# Altium footprint library NRF.PcbLib: 1 footprints
Each footprint in its own frame and in the unit in brackets; x right, y up, seen from the top. Pads: shape width x height; smd on the part's side, far side on the other; paste and mask are expansions set on the pad; w line width, h text height; cw(c..) or ccw(c..) is an arc to the next point about the centre after c.
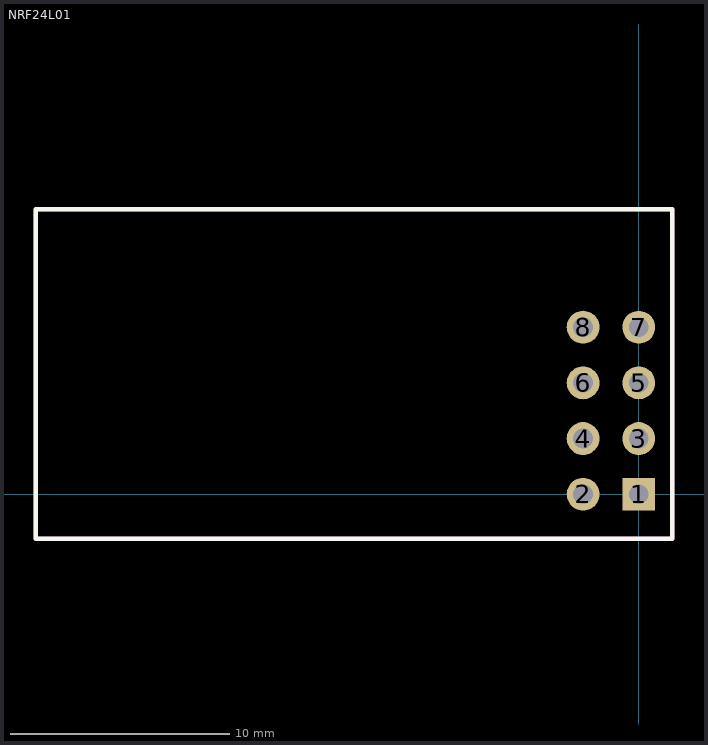
[diagram p0: the footprint, top view; thin cyan lines are the x and y axes]

## NRF24L01 [mm] "NRF24L01 module"
pads (8):
  rect 1.5x1.5 hole 0.9: 1(0,0)
  round 1.5 hole 0.9: 2(-2.54,0) 3(0,2.54) 4(-2.54,2.54) 5(0,5.08) 6(-2.54,5.08) 7(0,7.62) 8(-2.54,7.62)
Top Overlay:
  lines w0.203: -27.5,-2.032 -27.5,13 1.524,13 1.524,-2.032 -27.5,-2.032
Mechanical 13:
  lines w0.203: -27.5,-2.032 1.524,-2.032 1.524,13 -27.5,13 -27.5,-2.032
  text ".Comment" at -11.6,5.6 h0.51
  text ".Designator" at -12.125,6.525 h0.51
3D body "NRF24L01.STEP": height 6.85, standoff 0, extent -27.5,-2 1.5,13